# Altium footprint library RDM_ALT_PCB.PcbLib: 129 footprints (part 5 of 9)
Each footprint in its own frame and in the unit in brackets; x right, y up, seen from the top. Pads: shape width x height; smd on the part's side, far side on the other; paste and mask are expansions set on the pad; w line width, h text height; cw(c..) or ccw(c..) is an arc to the next point about the centre after c.
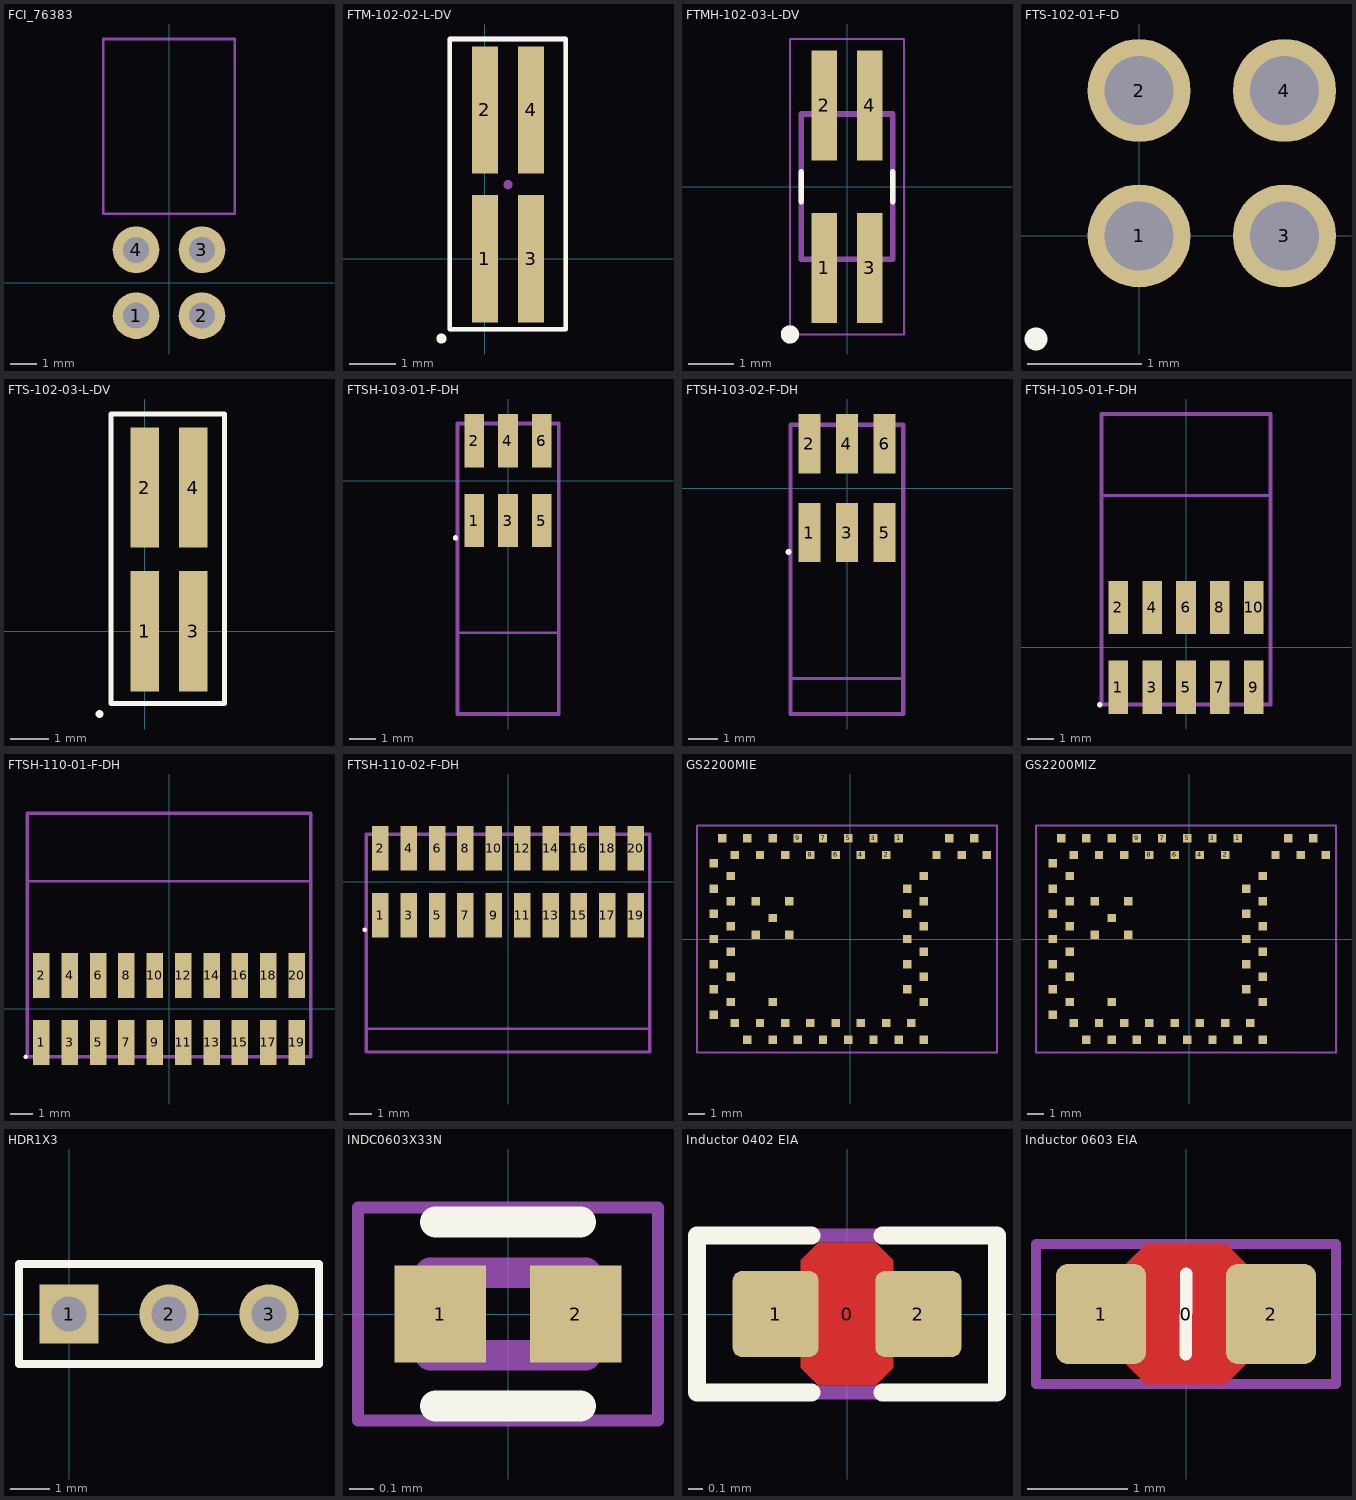
[diagram p4: the footprints below, top view; thin cyan lines are the x and y axes]

## FCI_76383 [mm]
height 7.8
pads (4):
  round 1.8 hole 1: 1(-1.27,-1.27) 2(1.27,-1.27) 3(1.27,1.27) 4(-1.27,1.27)
Mechanical 15:
  lines w0.1: -2.54,2.667 -2.54,9.398 2.54,9.398 2.54,2.667 -2.54,2.667

## FTM-102-02-L-DV [mm] "CONN HEADER SMD 4POS 1.00MM"
pads (4):
  rect 0.56x2.755 smd: 1(0,0) 2(0,3.215) 3(1,0) 4(1,3.215)
Top Overlay:
  circle w0.2: c-0.94,-1.727 r0.01
  lines w0.1: -0.762,-1.524 -0.762,4.75 1.75,4.75 1.75,-1.524 -0.754,-1.524
Mechanical 15:
  circle w0.1: c0.5,1.6 r0.05
  lines w0.1: -0.762,-1.524 -0.762,4.75 1.75,4.75 1.75,-1.524 -0.762,-1.524
3D body "FTM-102-02-L-DV.stp": height 3.13, standoff -0.04, extent -0.5,-0.964 1.5,4.243

## FTMH-102-03-L-DV [mm] "CONN HEADER SMD 4POS 1MM"
pads (4):
  rect 0.56x2.41 smd: 1(-0.5,-1.78) 2(-0.5,1.78) 3(0.5,-1.78) 4(0.5,1.78)
Top Overlay:
  circle w0.2: c-1.25,-3.235 r0.1
  lines w0.127: -1,-0.325 -1,0.325 ; 1,-0.325 1,0.325
Mechanical 4:
  circle w0.2: c-0.5,-1.2 r0.1
  circle w0.2: c-0.5,-1.2 r0.1
  lines w0.127: -1,-1.59 -1,1.59 ; -1,-1.59 1,-1.59 ; -1,-1.59 -1,1.59 ; -1,-1.59 1,-1.59 ; -1,1.59 1,1.59 ; -1,1.59 1,1.59 ; 1,-1.59 1,1.59 ; 1,-1.59 1,1.59
Mechanical 16:
  lines w0.05: -1.25,-3.235 1.25,-3.235 1.25,3.235 -1.25,3.235 -1.25,-3.235

## FTS-102-01-F-D [mm] "CONN HEADER SMD 4POS 1.27 MM THROUGH HOLE"
pads (4):
  round 0.9 hole 0.6: 1(0,0) 2(0,1.27) 3(1.27,0) 4(1.27,1.27)
Top Overlay:
  circle w0.2: c-0.9,-0.9 r0
3D body "CON4_2x2_TU_FTS.step": height 6.46, standoff -2.53, extent -0.635,-0.635 1.905,1.905

## FTS-102-03-L-DV [mm] "CONN HEADER SMD 4POS 1.27MM"
pads (4):
  rect 0.74x3.125 smd: 1(0,0) 2(0,3.735) 3(1.27,0) 4(1.27,3.735)
Top Overlay:
  circle w0.2: c-1.17,-2.15 r0
  lines w0.127: -0.875,-1.875 -0.875,5.65 2.075,5.65 2.075,-1.875 -0.875,-1.875
Mechanical 15:
  lines w0.1: -0.875,-1.875 -0.875,5.65 2.075,5.65 2.075,-1.875 -0.875,-1.875
3D body "stiftleiste_a-sl127-dg-g04mp1.stp": height 6.41, standoff 0.01, extent -0.645,-0.877 1.895,4.627

## FTSH-103-01-F-DH [mm] "FTSH-103-01-F-DH"
height 3.175
pads (6):
  rect 0.737x2 smd mask+0.051: 1(-1.27,-1.5) 2(-1.27,1.5) 3(0,-1.5) 4(0,1.5) 5(1.27,-1.5) 6(1.27,1.5)
Top Overlay:
  circle w0.2: c-1.97,-2.15 r0
Mechanical 13:
  lines w0.1: -1.905,-5.712 1.905,-5.712
  lines w0.15: -1.905,-8.762 1.905,-8.762 1.905,2.134 -1.905,2.134 -1.905,-8.762
3D body "FTSH-103-01-F-DH.stp": height 3.43, standoff 0, extent -1.905,-8.762 1.905,2.134

## FTSH-103-02-F-DH [mm] "FTSH-103-02-F-DH"
height 3.175
pads (6):
  rect 0.737x2 smd mask+0.051: 1(-1.27,-1.5) 2(-1.27,1.5) 3(0,-1.5) 4(0,1.5) 5(1.27,-1.5) 6(1.27,1.5)
Top Overlay:
  circle w0.2: c-1.97,-2.15 r0
Mechanical 13:
  lines w0.1: -1.905,-6.428 1.905,-6.428
  lines w0.15: -1.905,-7.619 1.905,-7.619 1.905,2.134 -1.905,2.134 -1.905,-7.619
3D body "FTSH-103-02-F-DH.stp": height 3.43, standoff 0, extent -1.905,-7.619 1.905,2.134

## FTSH-105-01-F-DH [mm] "FTSH-105-01-F-DH"
height 3.175
pads (10):
  rect 0.737x2 smd mask+0.051: 1(-2.54,-1.5) 2(-2.54,1.5) 3(-1.27,-1.5) 4(-1.27,1.5) 5(0,-1.5) 6(0,1.5) 7(1.27,-1.5) 8(1.27,1.5) 9(2.54,-1.5) 10(2.54,1.5)
Top Overlay:
  circle w0.2: c-3.24,-2.15 r0
Mechanical 13:
  lines w0.1: -3.175,5.7 3.175,5.7
  lines w0.15: -3.175,-2.134 3.175,-2.134 3.175,8.762 -3.175,8.762 -3.175,-2.134
3D body "FTSH-105-01-F-DH.stp": height 3.43, standoff 0, extent -3.175,-2.134 3.175,8.762

## FTSH-110-01-F-DH [mm] "FTSH-110-01-F-DH"
height 3.175
pads (20):
  rect 0.737x2 smd mask+0.051: 1(-5.715,-1.5) 2(-5.715,1.5) 3(-4.445,-1.5) 4(-4.445,1.5) 5(-3.175,-1.5) 6(-3.175,1.5) 7(-1.905,-1.5) 8(-1.905,1.5) 9(-0.635,-1.5) 10(-0.635,1.5) 11(0.635,-1.5) 12(0.635,1.5) 13(1.905,-1.5) 14(1.905,1.5) 15(3.175,-1.5) 16(3.175,1.5) 17(4.445,-1.5) 18(4.445,1.5) 19(5.715,-1.5) 20(5.715,1.5)
Top Overlay:
  circle w0.2: c-6.415,-2.15 r0
Mechanical 13:
  lines w0.1: -6.35,5.712 6.35,5.712
  lines w0.15: -6.35,-2.134 -6.35,8.762 6.35,8.762 6.35,-2.134 -6.35,-2.134
3D body "FTSH-110-01-F-DH.stp": height 3.43, standoff 0, extent -6.35,-2.134 6.35,8.762

## FTSH-110-02-F-DH [mm] "FTSH-110-02-F-DH"
height 3.175
pads (20):
  rect 0.737x2 smd mask+0.051: 1(-5.715,-1.5) 2(-5.715,1.5) 3(-4.445,-1.5) 4(-4.445,1.5) 5(-3.175,-1.5) 6(-3.175,1.5) 7(-1.905,-1.5) 8(-1.905,1.5) 9(-0.635,-1.5) 10(-0.635,1.5) 11(0.635,-1.5) 12(0.635,1.5) 13(1.905,-1.5) 14(1.905,1.5) 15(3.175,-1.5) 16(3.175,1.5) 17(4.445,-1.5) 18(4.445,1.5) 19(5.715,-1.5) 20(5.715,1.5)
Top Overlay:
  circle w0.2: c-6.415,-2.15 r0
Mechanical 13:
  lines w0.1: -6.35,-6.578 6.35,-6.578
  lines w0.15: -6.35,-7.619 6.35,-7.619 6.35,2.134 -6.35,2.134 -6.35,-7.619
3D body "FTSH-110-02-F-DH.stp": height 3.43, standoff 0, extent -6.35,-7.619 6.35,2.134

## GS2200MIE [mm] "BGA, 81-Leads, Body 5,09x5,39mmx0,60mm, Pitch 0,40mm"
height 0.6
pads (66):
  rect 0.5x0.5 smd mask+0.05: 1(2.875,6) 2(2.125,5) 3(1.375,6) 4(0.625,5) 5(-0.125,6) 6(-0.875,5) 7(-1.625,6) 8(-2.375,5) 9(-3.125,6) 10(-3.875,5) 11(-4.625,6) 12(-5.375,5) 13(-6.125,6) 14(-6.875,5) 15(-7.625,6) 16(-8.125,4.5) 17(-7.125,3.75) 18(-8.125,3) 19(-7.125,2.25) 20(-8.125,1.5) 21(-7.125,0.75) 22(-8.125,0) 23(-7.125,-0.75) 24(-8.125,-1.5) 25(-7.125,-2.25) 26(-8.125,-3) 27(-7.125,-3.75) 28(-8.125,-4.5) 29(-6.875,-5) 30(-6.125,-6) 31(-5.375,-5) 32(-4.625,-6) 33(-3.875,-5) 34(-3.125,-6) 35(-2.375,-5) 36(-1.625,-6) 37(-0.875,-5) 38(-0.125,-6) 39(0.625,-5) 40(1.375,-6) 41(2.125,-5) 42(2.875,-6) 43(3.625,-5) 44(4.375,-6) 45(4.375,-3.75) 46(3.375,-3) 47(4.375,-2.25) 48(3.375,-1.5) 49(4.375,-0.75) 50(3.375,0) 51(4.375,0.75) 52(3.375,1.5) 53(4.375,2.25) 54(3.375,3) 55(4.375,3.75) 56(5.125,5) 57(5.875,6) 58(6.625,5) 59(7.375,6) 60(8.125,5) 61(-5.625,2.25) 62(-3.625,2.25) 63(-4.625,1.25) 64(-5.625,0.25) 65(-3.625,0.25) 66(-4.625,-3.75)
Mechanical 1:
  lines w0.1: -9.125,-6.75 -9.125,6.75 8.726,6.75 8.726,-6.75 -9.125,-6.75
  text "'.Designator'" at -4.01,-0.278 h0.5
3D body: height 1, standoff 0, extent -9.102,-6.688 8.748,6.816
3D body: height 2, standoff 1, extent -8.777,-6.343 4.028,6.462
3D body: height 2.2, standoff 2, extent -8.256,-5.868 3.506,5.987
3D body "User Library-20279-001.STEP": height 2.25, standoff 0.99, extent 5.052,3.355 8.052,6.455

## GS2200MIZ [mm] "BGA, 81-Leads, Body 5,09x5,39mmx0,60mm, Pitch 0,40mm"
height 0.6
pads (66):
  rect 0.5x0.5 smd mask+0.05: 1(2.875,6) 2(2.125,5) 3(1.375,6) 4(0.625,5) 5(-0.125,6) 6(-0.875,5) 7(-1.625,6) 8(-2.375,5) 9(-3.125,6) 10(-3.875,5) 11(-4.625,6) 12(-5.375,5) 13(-6.125,6) 14(-6.875,5) 15(-7.625,6) 16(-8.125,4.5) 17(-7.125,3.75) 18(-8.125,3) 19(-7.125,2.25) 20(-8.125,1.5) 21(-7.125,0.75) 22(-8.125,0) 23(-7.125,-0.75) 24(-8.125,-1.5) 25(-7.125,-2.25) 26(-8.125,-3) 27(-7.125,-3.75) 28(-8.125,-4.5) 29(-6.875,-5) 30(-6.125,-6) 31(-5.375,-5) 32(-4.625,-6) 33(-3.875,-5) 34(-3.125,-6) 35(-2.375,-5) 36(-1.625,-6) 37(-0.875,-5) 38(-0.125,-6) 39(0.625,-5) 40(1.375,-6) 41(2.125,-5) 42(2.875,-6) 43(3.625,-5) 44(4.375,-6) 45(4.375,-3.75) 46(3.375,-3) 47(4.375,-2.25) 48(3.375,-1.5) 49(4.375,-0.75) 50(3.375,0) 51(4.375,0.75) 52(3.375,1.5) 53(4.375,2.25) 54(3.375,3) 55(4.375,3.75) 56(5.125,5) 57(5.875,6) 58(6.625,5) 59(7.375,6) 60(8.125,5) 61(-5.625,2.25) 62(-3.625,2.25) 63(-4.625,1.25) 64(-5.625,0.25) 65(-3.625,0.25) 66(-4.625,-3.75)
Mechanical 1:
  lines w0.1: -9.125,-6.75 -9.125,6.75 8.726,6.75 8.726,-6.75 -9.125,-6.75
  text "'.Designator'" at -4.01,-0.278 h0.5
3D body: height 1, standoff 0, extent -9.102,-6.688 8.748,6.816
3D body: height 2, standoff 1, extent -8.777,-6.343 4.028,6.462
3D body: height 2.2, standoff 2, extent -8.256,-5.868 3.506,5.987
3D body "User Library-ANTENNA_WLAN.STEP": height 2.02, standoff 0.98, extent 5.693,-6.443 7.733,3.097

## HDR1X3 [mm] "Connector; Header; 3 Position"
pads (3):
  rect 1.5x1.5 hole 0.9: 1(0,0)
  round 1.5 hole 0.9: 2(2.54,0) 3(5.08,0)
Top Overlay:
  lines w0.2: -1.27,-1.27 -1.27,1.27 6.35,1.27 6.35,-1.27 -1.27,-1.27

## INDC0603X33N [mm] "IND_0201"
pads (2):
  rect 0.38x0.4 smd: 1(-0.28,0) 2(0.28,0)
Top Overlay:
  lines w0.127: -0.3,-0.38 0.3,-0.38 ; -0.3,0.38 0.3,0.38
Mechanical 4:
  lines w0.127: -0.32,-0.17 0.32,-0.17 ; -0.32,-0.17 -0.32,0.17 ; -0.32,-0.17 0.32,-0.17 ; -0.32,-0.17 -0.32,0.17 ; -0.32,0.17 0.32,0.17 ; -0.32,0.17 0.32,0.17 ; 0.32,-0.17 0.32,0.17 ; 0.32,-0.17 0.32,0.17
Mechanical 16:
  lines w0.05: -0.62,-0.44 0.62,-0.44 0.62,0.44 -0.62,0.44 -0.62,-0.44

## Inductor 0402 EIA [mm]
pads (3):
  round 0.2 on Mech15: 0(0,0)
  rrect20% 0.6x0.6 smd: 1(-0.5,0) 2(0.5,0)
Top Layer:
  pour cut-out: -0.325,0.375 -0.2,0.5 0.2,0.5 0.325,0.375 0.325,-0.375 0.2,-0.5 -0.2,-0.5 -0.325,-0.375
Top Overlay:
  lines w0.127: -0.25,-0.55 -1.05,-0.55 -1.05,0.55 -0.25,0.55 ; 0.25,-0.55 1.05,-0.55 1.05,0.55 0.25,0.55
Mechanical 13:
  lines w0.05: 0.225,-0.274 -0.225,-0.274 0.225,-0.274 ; -0.525,-0.275 -0.225,-0.275 -0.225,0.275 -0.525,0.275 -0.525,-0.275 ; -0.225,0.274 0.225,0.274 -0.225,0.274 ; 0.225,-0.275 0.225,0.275 0.525,0.275 0.525,-0.275 0.225,-0.275
Mechanical 15:
  lines w0.1: -1.05,-0.55 1.05,-0.55 1.05,0.55 -1.05,0.55 -1.05,-0.55
3D body "RES 0402 (1005 metric).STEP": height 0.4, standoff 0, extent -0.525,-0.275 0.525,0.275

## Inductor 0603 EIA [mm]
pads (3):
  round 0.254 on Mech15: 0(0,0)
  rrect25% 0.9x1 smd: 1(-0.85,0) 2(0.85,0)
Top Layer:
  pour cut-out: -0.6,0.5 -0.4,0.7 0.4,0.7 0.6,0.5 0.6,-0.5 0.4,-0.7 -0.4,-0.7 -0.6,-0.5
Top Overlay:
  lines w0.127: -0.001,-0.403 0.001,0.403
Mechanical 13:
  lines w0.05: -0.875,-0.475 -0.475,-0.475 -0.475,0.475 -0.875,0.475 -0.875,-0.475 ; -0.475,-0.474 0.475,-0.474 -0.475,-0.474 ; -0.475,0.474 0.475,0.474 -0.475,0.474 ; 0.475,-0.475 0.475,0.475 0.875,0.475 0.875,-0.475 0.475,-0.475
Mechanical 15:
  lines w0.1: -1.5,-0.7 -1.5,0.7 1.5,0.7 1.5,-0.7 -1.5,-0.7
3D body "RES 0603 (1608 metric).STEP": height 0.54, standoff -0.01, extent -0.875,-0.475 0.875,0.475